# Altium schematic symbol library jlcpcb_2025_04_inductors_extended_0603.schlib: 1269 symbols (part 5 of 7) (continued)
## MLF1608A3R3JTD25
designator L?  Inductance: 3.3uH
Inductor, 3.3uH, ±5%, 550mΩ, 30mA, SMD 0603; Manufacturer: TDK; Manufacturer Part Number: MLF1608A3R3JTD25; Self-Resonant Frequency: 65MHz; Q Factor: 35@10MHz; Package Size: 0603; JLCPCB Basic Part: No; JLCPCB Part Number: C404525; Supplier 1: LCSC; Category: Inductors; Supplier Part Number 1: C404525; Tolerance: ±5%; Rated Current: 30mA; DC Resistance: 550mΩ; RoHS: Yes; ComponentLink1Description: Datasheet; ComponentLink1URL: https://wmsc.lcsc.com/wmsc/upload/file/pdf/v2/lcsc/2304140030_TDK-MLF1608A3R3JTD25_C404525.pdf; ComponentLink2Description: JLCPCB Part URL; ComponentLink2URL: https://jlcpcb.com/partdetail/C404525; ComponentLink3Description: LCSC Part URL; ComponentLink3URL: https://lcsc.com/product-detail/Inductors-SMD_TDK-TDK-MLF1608A3R3JTD25_C404525.html
footprint IND-0603 (0603 (1608M) Inductor)
pins: 1, 2

## MLF1608A3R3KTA00
designator L?  Inductance: 3.3uH
Inductor, 3.3uH, ±10%, 550mΩ, 30mA, SMD 0603; Manufacturer: TDK; Manufacturer Part Number: MLF1608A3R3KTA00; Self-Resonant Frequency: 65MHz; Q Factor: 35@10MHz; Package Size: 0603; JLCPCB Basic Part: No; JLCPCB Part Number: C574026; Supplier 1: LCSC; Category: Inductors; Supplier Part Number 1: C574026; Tolerance: ±10%; Rated Current: 30mA; DC Resistance: 550mΩ; RoHS: Yes; ComponentLink1Description: Datasheet; ComponentLink1URL: https://wmsc.lcsc.com/wmsc/upload/file/pdf/v2/lcsc/2304140030_TDK-MLF1608A3R3KTA00_C574026.pdf; ComponentLink2Description: JLCPCB Part URL; ComponentLink2URL: https://jlcpcb.com/partdetail/C574026; ComponentLink3Description: LCSC Part URL; ComponentLink3URL: https://lcsc.com/product-detail/Inductors-SMD_TDK-TDK-MLF1608A3R3KTA00_C574026.html
footprint IND-0603 (0603 (1608M) Inductor)
pins: 1, 2

## MLF1608A4R7JT000
designator L?  Inductance: 4.7uH
Inductor, 4.7uH, ±5%, 750mΩ, 30mA, SMD 0603; Manufacturer: TDK; Manufacturer Part Number: MLF1608A4R7JT000; Self-Resonant Frequency: 55MHz; Q Factor: 35@10MHz; Package Size: 0603; JLCPCB Basic Part: No; JLCPCB Part Number: C87515; Supplier 1: LCSC; Category: Inductors; Supplier Part Number 1: C87515; Tolerance: ±5%; Rated Current: 30mA; DC Resistance: 750mΩ; RoHS: Yes; ComponentLink1Description: Datasheet; ComponentLink1URL: https://wmsc.lcsc.com/wmsc/upload/file/pdf/v2/lcsc/2304140030_TDK-MLF1608A4R7JT000_C87515.pdf; ComponentLink2Description: JLCPCB Part URL; ComponentLink2URL: https://jlcpcb.com/partdetail/C87515; ComponentLink3Description: LCSC Part URL; ComponentLink3URL: https://lcsc.com/product-detail/Inductors-SMD_TDK-TDK-MLF1608A4R7JT000_C87515.html
footprint IND-0603 (0603 (1608M) Inductor)
pins: 1, 2

## MLF1608A4R7KTA00
designator L?  Inductance: 4.7uH
Inductor, 4.7uH, ±10%, 750mΩ, 30mA, SMD 0603; Manufacturer: TDK; Manufacturer Part Number: MLF1608A4R7KTA00; Self-Resonant Frequency: 80MHz; Q Factor: 60@10MHz; Package Size: 0603; JLCPCB Basic Part: No; JLCPCB Part Number: C76730; Supplier 1: LCSC; Category: Inductors; Supplier Part Number 1: C76730; Tolerance: ±10%; Rated Current: 30mA; DC Resistance: 750mΩ; RoHS: Yes; ComponentLink1Description: Datasheet; ComponentLink1URL: https://wmsc.lcsc.com/wmsc/upload/file/pdf/v2/lcsc/2304140030_TDK-MLF1608A4R7KTA00_C76730.pdf; ComponentLink2Description: JLCPCB Part URL; ComponentLink2URL: https://jlcpcb.com/partdetail/C76730; ComponentLink3Description: LCSC Part URL; ComponentLink3URL: https://lcsc.com/product-detail/Inductors-SMD_TDK-TDK-MLF1608A4R7KTA00_C76730.html
footprint IND-0603 (0603 (1608M) Inductor)
pins: 1, 2

## MLF1608A4R7KTD25
designator L?  Inductance: 4.7uH
Inductor, 4.7uH, ±10%, 750mΩ, 30mA, SMD 0603; Manufacturer: TDK; Manufacturer Part Number: MLF1608A4R7KTD25; Self-Resonant Frequency: 80MHz; Q Factor: 60@10MHz; Package Size: 0603; JLCPCB Basic Part: No; JLCPCB Part Number: C193265; Supplier 1: LCSC; Category: Inductors; Supplier Part Number 1: C193265; Tolerance: ±10%; Rated Current: 30mA; DC Resistance: 750mΩ; RoHS: Yes; ComponentLink1Description: Datasheet; ComponentLink1URL: https://wmsc.lcsc.com/wmsc/upload/file/pdf/v2/lcsc/2304140030_TDK-MLF1608A4R7KTD25_C193265.pdf; ComponentLink2Description: JLCPCB Part URL; ComponentLink2URL: https://jlcpcb.com/partdetail/C193265; ComponentLink3Description: LCSC Part URL; ComponentLink3URL: https://lcsc.com/product-detail/Inductors-SMD_TDK-TDK-MLF1608A4R7KTD25_C193265.html
footprint IND-0603 (0603 (1608M) Inductor)
pins: 1, 2

## MLF1608A4R7MTD25
designator L?  Inductance: 4.7uH
Inductor, 4.7uH, ±20%, 750mΩ, 30mA, SMD 0603; Manufacturer: TDK; Manufacturer Part Number: MLF1608A4R7MTD25; Self-Resonant Frequency: 55MHz; Q Factor: 35@10MHz; Package Size: 0603; JLCPCB Basic Part: No; JLCPCB Part Number: C502019; Supplier 1: LCSC; Category: Inductors; Supplier Part Number 1: C502019; Tolerance: ±20%; Rated Current: 30mA; DC Resistance: 750mΩ; RoHS: Yes; ComponentLink1Description: Datasheet; ComponentLink1URL: https://wmsc.lcsc.com/wmsc/upload/file/pdf/v2/lcsc/2304140030_TDK-MLF1608A4R7MTD25_C502019.pdf; ComponentLink2Description: JLCPCB Part URL; ComponentLink2URL: https://jlcpcb.com/partdetail/C502019; ComponentLink3Description: LCSC Part URL; ComponentLink3URL: https://lcsc.com/product-detail/Inductors-SMD_TDK-TDK-MLF1608A4R7MTD25_C502019.html
footprint IND-0603 (0603 (1608M) Inductor)
pins: 1, 2

## MLF1608C150KTA00
designator L?  Inductance: 15uH
Inductor, 15uH, ±10%, 800mΩ, 2mA, SMD 0603; Manufacturer: TDK; Manufacturer Part Number: MLF1608C150KTA00; Self-Resonant Frequency: 42MHz; Q Factor: 40@1MHz; Package Size: 0603; JLCPCB Basic Part: No; JLCPCB Part Number: C275348; Supplier 1: LCSC; Category: Inductors; Supplier Part Number 1: C275348; Tolerance: ±10%; Rated Current: 2mA; DC Resistance: 800mΩ; RoHS: Yes; ComponentLink1Description: Datasheet; ComponentLink1URL: https://wmsc.lcsc.com/wmsc/upload/file/pdf/v2/lcsc/2304140030_TDK-MLF1608C150KTA00_C275348.pdf; ComponentLink2Description: JLCPCB Part URL; ComponentLink2URL: https://jlcpcb.com/partdetail/C275348; ComponentLink3Description: LCSC Part URL; ComponentLink3URL: https://lcsc.com/product-detail/Inductors-SMD_TDK-TDK-MLF1608C150KTA00_C275348.html
footprint IND-0603 (0603 (1608M) Inductor)
pins: 1, 2

## MLF1608C180KTA00
designator L?  Inductance: 18uH
Inductor, 18uH, ±10%, 850mΩ, 2mA, SMD 0603; Manufacturer: TDK; Manufacturer Part Number: MLF1608C180KTA00; Self-Resonant Frequency: 40MHz; Q Factor: 40@1MHz; Package Size: 0603; JLCPCB Basic Part: No; JLCPCB Part Number: C275349; Supplier 1: LCSC; Category: Inductors; Supplier Part Number 1: C275349; Tolerance: ±10%; Rated Current: 2mA; DC Resistance: 850mΩ; RoHS: Yes; ComponentLink1Description: Datasheet; ComponentLink1URL: https://wmsc.lcsc.com/wmsc/upload/file/pdf/v2/lcsc/2304140030_TDK-MLF1608C180KTA00_C275349.pdf; ComponentLink2Description: JLCPCB Part URL; ComponentLink2URL: https://jlcpcb.com/partdetail/C275349; ComponentLink3Description: LCSC Part URL; ComponentLink3URL: https://lcsc.com/product-detail/Inductors-SMD_TDK-TDK-MLF1608C180KTA00_C275349.html
footprint IND-0603 (0603 (1608M) Inductor)
pins: 1, 2

## MLF1608C180KTD25
designator L?  Inductance: 18uH
Inductor, 18uH, ±10%, 850mΩ, 2mA, SMD 0603; Manufacturer: TDK; Manufacturer Part Number: MLF1608C180KTD25; Self-Resonant Frequency: 40MHz; Q Factor: 40@1MHz; Package Size: 0603; JLCPCB Basic Part: No; JLCPCB Part Number: C524458; Supplier 1: LCSC; Category: Inductors; Supplier Part Number 1: C524458; Tolerance: ±10%; Rated Current: 2mA; DC Resistance: 850mΩ; RoHS: Yes; ComponentLink1Description: Datasheet; ComponentLink1URL: https://wmsc.lcsc.com/wmsc/upload/file/pdf/v2/lcsc/2007171235_TDK-MLF1608C180KTD25_C524458.pdf; ComponentLink2Description: JLCPCB Part URL; ComponentLink2URL: https://jlcpcb.com/partdetail/C524458; ComponentLink3Description: LCSC Part URL; ComponentLink3URL: https://lcsc.com/product-detail/Inductors-SMD_TDK-TDK-MLF1608C180KTD25_C524458.html
footprint IND-0603 (0603 (1608M) Inductor)
pins: 1, 2

## MLF1608C220KTA00
designator L?  Inductance: 22uH
Inductor, 22uH, ±10%, 900mΩ, 2mA, SMD 0603; Manufacturer: TDK; Manufacturer Part Number: MLF1608C220KTA00; Self-Resonant Frequency: 18MHz; Q Factor: 20@1MHz; Package Size: 0603; JLCPCB Basic Part: No; JLCPCB Part Number: C275350; Supplier 1: LCSC; Category: Inductors; Supplier Part Number 1: C275350; Tolerance: ±10%; Rated Current: 2mA; DC Resistance: 900mΩ; RoHS: Yes; ComponentLink1Description: Datasheet; ComponentLink1URL: https://wmsc.lcsc.com/wmsc/upload/file/pdf/v2/lcsc/2304140030_TDK-MLF1608C220KTA00_C275350.pdf; ComponentLink2Description: JLCPCB Part URL; ComponentLink2URL: https://jlcpcb.com/partdetail/C275350; ComponentLink3Description: LCSC Part URL; ComponentLink3URL: https://lcsc.com/product-detail/Inductors-SMD_TDK-TDK-MLF1608C220KTA00_C275350.html
footprint IND-0603 (0603 (1608M) Inductor)
pins: 1, 2

## MLF1608C220KTD25
designator L?  Inductance: 22uH
Inductor, 22uH, ±10%, 900mΩ, 2mA, SMD 0603; Manufacturer: TDK; Manufacturer Part Number: MLF1608C220KTD25; Self-Resonant Frequency: 38MHz; Q Factor: 40@1MHz; Package Size: 0603; JLCPCB Basic Part: No; JLCPCB Part Number: C1330708; Supplier 1: LCSC; Category: Inductors; Supplier Part Number 1: C1330708; Tolerance: ±10%; Rated Current: 2mA; DC Resistance: 900mΩ; RoHS: Yes; ComponentLink1Description: Datasheet; ComponentLink1URL: https://wmsc.lcsc.com/wmsc/upload/file/pdf/v2/lcsc/2304140030_TDK-MLF1608C220KTD25_C1330708.pdf; ComponentLink2Description: JLCPCB Part URL; ComponentLink2URL: https://jlcpcb.com/partdetail/C1330708; ComponentLink3Description: LCSC Part URL; ComponentLink3URL: https://lcsc.com/product-detail/Inductors-SMD_TDK-TDK-MLF1608C220KTD25_C1330708.html
footprint IND-0603 (0603 (1608M) Inductor)
pins: 1, 2

## MLF1608C330KTD00
designator L?  Inductance: 33uH
Inductor, 33uH, ±10%, 1.4Ω, 2mA, SMD 0603; Manufacturer: TDK; Manufacturer Part Number: MLF1608C330KTD00; Self-Resonant Frequency: 10MHz; Q Factor: 20@1MHz; Package Size: 0603; JLCPCB Basic Part: No; JLCPCB Part Number: C275351; Supplier 1: LCSC; Category: Inductors; Supplier Part Number 1: C275351; Tolerance: ±10%; Rated Current: 2mA; DC Resistance: 1.4Ω; RoHS: Yes; ComponentLink1Description: Datasheet; ComponentLink1URL: https://wmsc.lcsc.com/wmsc/upload/file/pdf/v2/lcsc/2304140030_TDK-MLF1608C330KTD00_C275351.pdf; ComponentLink2Description: JLCPCB Part URL; ComponentLink2URL: https://jlcpcb.com/partdetail/C275351; ComponentLink3Description: LCSC Part URL; ComponentLink3URL: https://lcsc.com/product-detail/Inductors-SMD_TDK-TDK-MLF1608C330KTD00_C275351.html
footprint IND-0603 (0603 (1608M) Inductor)
pins: 1, 2

## MLF1608D47NMTA00
designator L?  Inductance: 47nH
Inductor, 47nH, ±20%, 100mΩ, 200mA, SMD 0603; Manufacturer: TDK; Manufacturer Part Number: MLF1608D47NMTA00; Self-Resonant Frequency: 900MHz; Q Factor: 20@50MHz; Package Size: 0603; JLCPCB Basic Part: No; JLCPCB Part Number: C440659; Supplier 1: LCSC; Category: Inductors; Supplier Part Number 1: C440659; Tolerance: ±20%; Rated Current: 200mA; DC Resistance: 100mΩ; RoHS: Yes; ComponentLink1Description: Datasheet; ComponentLink1URL: https://wmsc.lcsc.com/wmsc/upload/file/pdf/v2/lcsc/1912111437_TDK-MLF1608D47NMTA00_C440659.pdf; ComponentLink2Description: JLCPCB Part URL; ComponentLink2URL: https://jlcpcb.com/partdetail/C440659; ComponentLink3Description: LCSC Part URL; ComponentLink3URL: https://lcsc.com/product-detail/Inductors-SMD_TDK-TDK-MLF1608D47NMTA00_C440659.html
footprint IND-0603 (0603 (1608M) Inductor)
pins: 1, 2

## MLF1608D68NMTA00
designator L?  Inductance: 68nH
Inductor, 68nH, ±20%, 150mΩ, 200mA, SMD 0603; Manufacturer: TDK; Manufacturer Part Number: MLF1608D68NMTA00; Self-Resonant Frequency: 700MHz; Q Factor: 20@50MHz; Package Size: 0603; JLCPCB Basic Part: No; JLCPCB Part Number: C275352; Supplier 1: LCSC; Category: Inductors; Supplier Part Number 1: C275352; Tolerance: ±20%; Rated Current: 200mA; DC Resistance: 150mΩ; RoHS: Yes; ComponentLink1Description: Datasheet; ComponentLink1URL: https://wmsc.lcsc.com/wmsc/upload/file/pdf/v2/lcsc/2304140030_TDK-MLF1608D68NMTA00_C275352.pdf; ComponentLink2Description: JLCPCB Part URL; ComponentLink2URL: https://jlcpcb.com/partdetail/C275352; ComponentLink3Description: LCSC Part URL; ComponentLink3URL: https://lcsc.com/product-detail/Inductors-SMD_TDK-TDK-MLF1608D68NMTA00_C275352.html
footprint IND-0603 (0603 (1608M) Inductor)
pins: 1, 2

## MLF1608D82NMTD25
designator L?  Inductance: 82nH
Inductor, 82nH, ±20%, 150mΩ, 200mA, SMD 0603; Manufacturer: TDK; Manufacturer Part Number: MLF1608D82NMTD25; Self-Resonant Frequency: 500MHz; Q Factor: 10@50MHz; Package Size: 0603; JLCPCB Basic Part: No; JLCPCB Part Number: C165813; Supplier 1: LCSC; Category: Inductors; Supplier Part Number 1: C165813; Tolerance: ±20%; Rated Current: 200mA; DC Resistance: 150mΩ; RoHS: Yes; ComponentLink1Description: Datasheet; ComponentLink1URL: https://wmsc.lcsc.com/wmsc/upload/file/pdf/v2/lcsc/1811131649_TDK-MLF1608D82NMTD25_C165813.pdf; ComponentLink2Description: JLCPCB Part URL; ComponentLink2URL: https://jlcpcb.com/partdetail/C165813; ComponentLink3Description: LCSC Part URL; ComponentLink3URL: https://lcsc.com/product-detail/Inductors-SMD_TDK-TDK-MLF1608D82NMTD25_C165813.html
footprint IND-0603 (0603 (1608M) Inductor)
pins: 1, 2

## MLF1608DR10KTA00
designator L?  Inductance: 100nH
Inductor, 100nH, ±10%, 200mΩ, 200mA, SMD 0603; Manufacturer: TDK; Manufacturer Part Number: MLF1608DR10KTA00; Self-Resonant Frequency: 450MHz; Q Factor: 15@25MHz; Package Size: 0603; JLCPCB Basic Part: No; JLCPCB Part Number: C87516; Supplier 1: LCSC; Category: Inductors; Supplier Part Number 1: C87516; Tolerance: ±10%; Rated Current: 200mA; DC Resistance: 200mΩ; RoHS: Yes; ComponentLink1Description: Datasheet; ComponentLink1URL: https://wmsc.lcsc.com/wmsc/upload/file/pdf/v2/lcsc/2304140030_TDK-MLF1608DR10KTA00_C87516.pdf; ComponentLink2Description: JLCPCB Part URL; ComponentLink2URL: https://jlcpcb.com/partdetail/C87516; ComponentLink3Description: LCSC Part URL; ComponentLink3URL: https://lcsc.com/product-detail/Inductors-SMD_TDK-TDK-MLF1608DR10KTA00_C87516.html
footprint IND-0603 (0603 (1608M) Inductor)
pins: 1, 2

## MLF1608DR12JT000
designator L?  Inductance: 120nH
Inductor, 120nH, ±5%, 200mΩ, 200mA, SMD 0603; Manufacturer: TDK; Manufacturer Part Number: MLF1608DR12JT000; Self-Resonant Frequency: 400MHz; Q Factor: 15@25MHz; Package Size: 0603; JLCPCB Basic Part: No; JLCPCB Part Number: C275354; Supplier 1: LCSC; Category: Inductors; Supplier Part Number 1: C275354; Tolerance: ±5%; Rated Current: 200mA; DC Resistance: 200mΩ; RoHS: Yes; ComponentLink1Description: Datasheet; ComponentLink1URL: https://wmsc.lcsc.com/wmsc/upload/file/pdf/v2/lcsc/2304140030_TDK-MLF1608DR12JT000_C275354.pdf; ComponentLink2Description: JLCPCB Part URL; ComponentLink2URL: https://jlcpcb.com/partdetail/C275354; ComponentLink3Description: LCSC Part URL; ComponentLink3URL: https://lcsc.com/product-detail/Inductors-SMD_TDK-TDK-MLF1608DR12JT000_C275354.html
footprint IND-0603 (0603 (1608M) Inductor)
pins: 1, 2

## MLF1608DR12JTD25
designator L?  Inductance: 120nH
Inductor, 120nH, ±5%, 200mΩ, 200mA, SMD 0603; Manufacturer: TDK; Manufacturer Part Number: MLF1608DR12JTD25; Self-Resonant Frequency: 550MHz; Q Factor: 25@25MHz; Package Size: 0603; JLCPCB Basic Part: No; JLCPCB Part Number: C404510; Supplier 1: LCSC; Category: Inductors; Supplier Part Number 1: C404510; Tolerance: ±5%; Rated Current: 200mA; DC Resistance: 200mΩ; RoHS: Yes; ComponentLink1Description: Datasheet; ComponentLink1URL: https://wmsc.lcsc.com/wmsc/upload/file/pdf/v2/lcsc/2304140030_TDK-MLF1608DR12JTD25_C404510.pdf; ComponentLink2Description: JLCPCB Part URL; ComponentLink2URL: https://jlcpcb.com/partdetail/C404510; ComponentLink3Description: LCSC Part URL; ComponentLink3URL: https://lcsc.com/product-detail/Inductors-SMD_TDK-TDK-MLF1608DR12JTD25_C404510.html
footprint IND-0603 (0603 (1608M) Inductor)
pins: 1, 2

## MLF1608DR12KTA00
designator L?  Inductance: 120nH
Inductor, 120nH, ±10%, 200mΩ, 200mA, SMD 0603; Manufacturer: TDK; Manufacturer Part Number: MLF1608DR12KTA00; Self-Resonant Frequency: 400MHz; Q Factor: 15@25MHz; Package Size: 0603; JLCPCB Basic Part: No; JLCPCB Part Number: C87517; Supplier 1: LCSC; Category: Inductors; Supplier Part Number 1: C87517; Tolerance: ±10%; Rated Current: 200mA; DC Resistance: 200mΩ; RoHS: Yes; ComponentLink1Description: Datasheet; ComponentLink1URL: https://wmsc.lcsc.com/wmsc/upload/file/pdf/v2/lcsc/2304140030_TDK-MLF1608DR12KTA00_C87517.pdf; ComponentLink2Description: JLCPCB Part URL; ComponentLink2URL: https://jlcpcb.com/partdetail/C87517; ComponentLink3Description: LCSC Part URL; ComponentLink3URL: https://lcsc.com/product-detail/Inductors-SMD_TDK-TDK-MLF1608DR12KTA00_C87517.html
footprint IND-0603 (0603 (1608M) Inductor)
pins: 1, 2

## MLF1608DR15JT000
designator L?  Inductance: 150nH
Inductor, 150nH, ±5%, 250mΩ, 200mA, SMD 0603; Manufacturer: TDK; Manufacturer Part Number: MLF1608DR15JT000; Self-Resonant Frequency: 500MHz; Q Factor: 25@25MHz; Package Size: 0603; JLCPCB Basic Part: No; JLCPCB Part Number: C87518; Supplier 1: LCSC; Category: Inductors; Supplier Part Number 1: C87518; Tolerance: ±5%; Rated Current: 200mA; DC Resistance: 250mΩ; RoHS: Yes; ComponentLink1Description: Datasheet; ComponentLink1URL: https://wmsc.lcsc.com/wmsc/upload/file/pdf/v2/lcsc/2304140030_TDK-MLF1608DR15JT000_C87518.pdf; ComponentLink2Description: JLCPCB Part URL; ComponentLink2URL: https://jlcpcb.com/partdetail/C87518; ComponentLink3Description: LCSC Part URL; ComponentLink3URL: https://lcsc.com/product-detail/Inductors-SMD_TDK-TDK-MLF1608DR15JT000_C87518.html
footprint IND-0603 (0603 (1608M) Inductor)
pins: 1, 2

## MLF1608DR22JT000
designator L?  Inductance: 220nH
Inductor, 220nH, ±5%, 300mΩ, 150mA, SMD 0603; Manufacturer: TDK; Manufacturer Part Number: MLF1608DR22JT000; Self-Resonant Frequency: 400MHz; Q Factor: 25@25MHz; Package Size: 0603; JLCPCB Basic Part: No; JLCPCB Part Number: C136220; Supplier 1: LCSC; Category: Inductors; Supplier Part Number 1: C136220; Tolerance: ±5%; Rated Current: 150mA; DC Resistance: 300mΩ; RoHS: Yes; ComponentLink1Description: Datasheet; ComponentLink1URL: https://wmsc.lcsc.com/wmsc/upload/file/pdf/v2/lcsc/2304140030_TDK-MLF1608DR22JT000_C136220.pdf; ComponentLink2Description: JLCPCB Part URL; ComponentLink2URL: https://jlcpcb.com/partdetail/C136220; ComponentLink3Description: LCSC Part URL; ComponentLink3URL: https://lcsc.com/product-detail/Inductors-SMD_TDK-TDK-MLF1608DR22JT000_C136220.html
footprint IND-0603 (0603 (1608M) Inductor)
pins: 1, 2

## MLF1608DR22KTA00
designator L?  Inductance: 220nH
Inductor, 220nH, ±10%, 300mΩ, 150mA, SMD 0603; Manufacturer: TDK; Manufacturer Part Number: MLF1608DR22KTA00; Self-Resonant Frequency: 290MHz; Q Factor: 15@25MHz; Package Size: 0603; JLCPCB Basic Part: No; JLCPCB Part Number: C433006; Supplier 1: LCSC; Category: Inductors; Supplier Part Number 1: C433006; Tolerance: ±10%; Rated Current: 150mA; DC Resistance: 300mΩ; RoHS: Yes; ComponentLink1Description: Datasheet; ComponentLink1URL: https://wmsc.lcsc.com/wmsc/upload/file/pdf/v2/lcsc/2304140030_TDK-MLF1608DR22KTA00_C433006.pdf; ComponentLink2Description: JLCPCB Part URL; ComponentLink2URL: https://jlcpcb.com/partdetail/C433006; ComponentLink3Description: LCSC Part URL; ComponentLink3URL: https://lcsc.com/product-detail/Inductors-SMD_TDK-TDK-MLF1608DR22KTA00_C433006.html
footprint IND-0603 (0603 (1608M) Inductor)
pins: 1, 2

## MLF1608DR27JT000
designator L?  Inductance: 270nH
Inductor, 270nH, ±5%, 350mΩ, 150mA, SMD 0603; Manufacturer: TDK; Manufacturer Part Number: MLF1608DR27JT000; Self-Resonant Frequency: 260MHz; Q Factor: 15@25MHz; Package Size: 0603; JLCPCB Basic Part: No; JLCPCB Part Number: C87519; Supplier 1: LCSC; Category: Inductors; Supplier Part Number 1: C87519; Tolerance: ±5%; Rated Current: 150mA; DC Resistance: 350mΩ; RoHS: Yes; ComponentLink1Description: Datasheet; ComponentLink1URL: https://wmsc.lcsc.com/wmsc/upload/file/pdf/v2/lcsc/2304140030_TDK-MLF1608DR27JT000_C87519.pdf; ComponentLink2Description: JLCPCB Part URL; ComponentLink2URL: https://jlcpcb.com/partdetail/C87519; ComponentLink3Description: LCSC Part URL; ComponentLink3URL: https://lcsc.com/product-detail/Inductors-SMD_TDK-TDK-MLF1608DR27JT000_C87519.html
footprint IND-0603 (0603 (1608M) Inductor)
pins: 1, 2

## MLF1608DR33JT000
designator L?  Inductance: 330nH
Inductor, 330nH, ±5%, 400mΩ, 100mA, SMD 0603; Manufacturer: TDK; Manufacturer Part Number: MLF1608DR33JT000; Self-Resonant Frequency: 230MHz; Q Factor: 15@25MHz; Package Size: 0603; JLCPCB Basic Part: No; JLCPCB Part Number: C275357; Supplier 1: LCSC; Category: Inductors; Supplier Part Number 1: C275357; Tolerance: ±5%; Rated Current: 100mA; DC Resistance: 400mΩ; RoHS: Yes; ComponentLink1Description: Datasheet; ComponentLink1URL: https://wmsc.lcsc.com/wmsc/upload/file/pdf/v2/lcsc/2304140030_TDK-MLF1608DR33JT000_C275357.pdf; ComponentLink2Description: JLCPCB Part URL; ComponentLink2URL: https://jlcpcb.com/partdetail/C275357; ComponentLink3Description: LCSC Part URL; ComponentLink3URL: https://lcsc.com/product-detail/Inductors-SMD_TDK-TDK-MLF1608DR33JT000_C275357.html
footprint IND-0603 (0603 (1608M) Inductor)
pins: 1, 2

## MLF1608DR33KTA00
designator L?  Inductance: 330nH
Inductor, 330nH, ±10%, 400mΩ, 100mA, SMD 0603; Manufacturer: TDK; Manufacturer Part Number: MLF1608DR33KTA00; Self-Resonant Frequency: 230MHz; Q Factor: 15@25MHz; Package Size: 0603; JLCPCB Basic Part: No; JLCPCB Part Number: C87520; Supplier 1: LCSC; Category: Inductors; Supplier Part Number 1: C87520; Tolerance: ±10%; Rated Current: 100mA; DC Resistance: 400mΩ; RoHS: Yes; ComponentLink1Description: Datasheet; ComponentLink1URL: https://wmsc.lcsc.com/wmsc/upload/file/pdf/v2/lcsc/2304140030_TDK-MLF1608DR33KTA00_C87520.pdf; ComponentLink2Description: JLCPCB Part URL; ComponentLink2URL: https://jlcpcb.com/partdetail/C87520; ComponentLink3Description: LCSC Part URL; ComponentLink3URL: https://lcsc.com/product-detail/Inductors-SMD_TDK-TDK-MLF1608DR33KTA00_C87520.html
footprint IND-0603 (0603 (1608M) Inductor)
pins: 1, 2

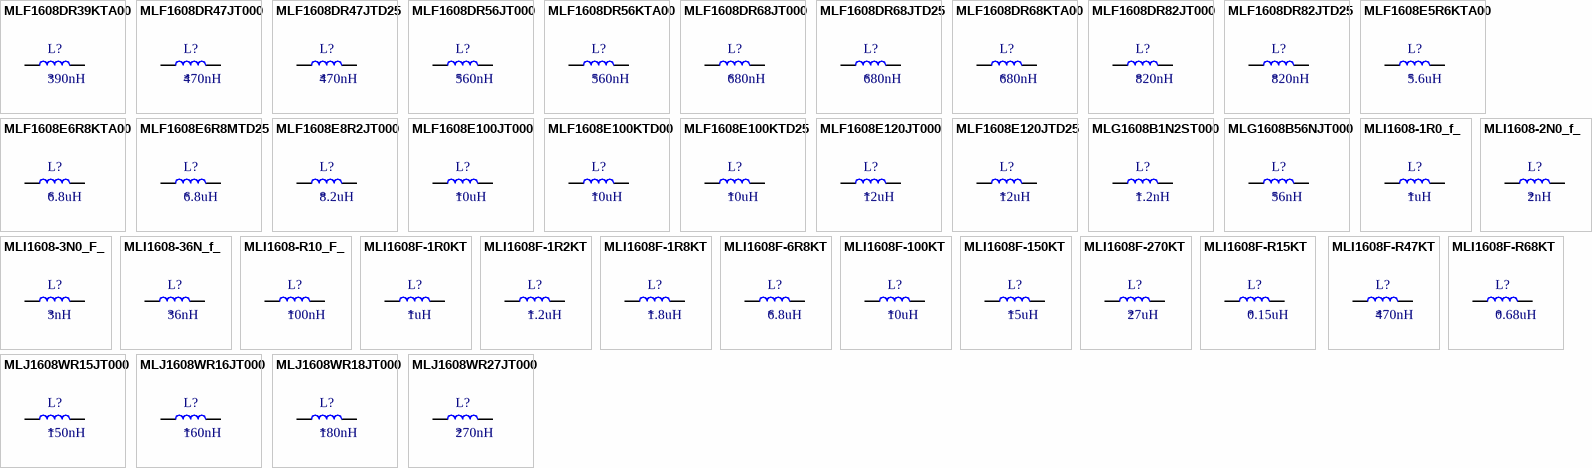
[diagram p21: symbols MLF1608DR39KTA00 to MLJ1608WR27JT000]

## MLF1608DR39KTA00
designator L?  Inductance: 390nH
Inductor, 390nH, ±10%, 450mΩ, 100mA, SMD 0603; Manufacturer: TDK; Manufacturer Part Number: MLF1608DR39KTA00; Self-Resonant Frequency: 210MHz; Q Factor: 15@25MHz; Package Size: 0603; JLCPCB Basic Part: No; JLCPCB Part Number: C76731; Supplier 1: LCSC; Category: Inductors; Supplier Part Number 1: C76731; Tolerance: ±10%; Rated Current: 100mA; DC Resistance: 450mΩ; RoHS: Yes; ComponentLink1Description: Datasheet; ComponentLink1URL: https://wmsc.lcsc.com/wmsc/upload/file/pdf/v2/lcsc/2304140030_TDK-MLF1608DR39KTA00_C76731.pdf; ComponentLink2Description: JLCPCB Part URL; ComponentLink2URL: https://jlcpcb.com/partdetail/C76731; ComponentLink3Description: LCSC Part URL; ComponentLink3URL: https://lcsc.com/product-detail/Inductors-SMD_TDK-TDK-MLF1608DR39KTA00_C76731.html
footprint IND-0603 (0603 (1608M) Inductor)
pins: 1, 2

## MLF1608DR47JT000
designator L?  Inductance: 470nH
Inductor, 470nH, ±5%, 500mΩ, 100mA, SMD 0603; Manufacturer: TDK; Manufacturer Part Number: MLF1608DR47JT000; Self-Resonant Frequency: 260MHz; Q Factor: 30@25MHz; Package Size: 0603; JLCPCB Basic Part: No; JLCPCB Part Number: C275359; Supplier 1: LCSC; Category: Inductors; Supplier Part Number 1: C275359; Tolerance: ±5%; Rated Current: 100mA; DC Resistance: 500mΩ; RoHS: Yes; ComponentLink1Description: Datasheet; ComponentLink1URL: https://wmsc.lcsc.com/wmsc/upload/file/pdf/v2/lcsc/2304140030_TDK-MLF1608DR47JT000_C275359.pdf; ComponentLink2Description: JLCPCB Part URL; ComponentLink2URL: https://jlcpcb.com/partdetail/C275359; ComponentLink3Description: LCSC Part URL; ComponentLink3URL: https://lcsc.com/product-detail/Inductors-SMD_TDK-TDK-MLF1608DR47JT000_C275359.html
footprint IND-0603 (0603 (1608M) Inductor)
pins: 1, 2

## MLF1608DR47JTD25
designator L?  Inductance: 470nH
Inductor, 470nH, ±5%, 500mΩ, 100mA, SMD 0603; Manufacturer: TDK; Manufacturer Part Number: MLF1608DR47JTD25; Self-Resonant Frequency: 190MHz; Q Factor: 15@25MHz; Package Size: 0603; JLCPCB Basic Part: No; JLCPCB Part Number: C404517; Supplier 1: LCSC; Category: Inductors; Supplier Part Number 1: C404517; Tolerance: ±5%; Rated Current: 100mA; DC Resistance: 500mΩ; RoHS: Yes; ComponentLink1Description: Datasheet; ComponentLink1URL: https://wmsc.lcsc.com/wmsc/upload/file/pdf/v2/lcsc/2304140030_TDK-MLF1608DR47JTD25_C404517.pdf; ComponentLink2Description: JLCPCB Part URL; ComponentLink2URL: https://jlcpcb.com/partdetail/C404517; ComponentLink3Description: LCSC Part URL; ComponentLink3URL: https://lcsc.com/product-detail/Inductors-SMD_TDK-TDK-MLF1608DR47JTD25_C404517.html
footprint IND-0603 (0603 (1608M) Inductor)
pins: 1, 2

## MLF1608DR56JT000
designator L?  Inductance: 560nH
Inductor, 560nH, ±5%, 550mΩ, 100mA, SMD 0603; Manufacturer: TDK; Manufacturer Part Number: MLF1608DR56JT000; Self-Resonant Frequency: 230MHz; Q Factor: 30@25MHz; Package Size: 0603; JLCPCB Basic Part: No; JLCPCB Part Number: C114773; Supplier 1: LCSC; Category: Inductors; Supplier Part Number 1: C114773; Tolerance: ±5%; Rated Current: 100mA; DC Resistance: 550mΩ; RoHS: Yes; ComponentLink1Description: Datasheet; ComponentLink1URL: https://wmsc.lcsc.com/wmsc/upload/file/pdf/v2/lcsc/2304140030_TDK-MLF1608DR56JT000_C114773.pdf; ComponentLink2Description: JLCPCB Part URL; ComponentLink2URL: https://jlcpcb.com/partdetail/C114773; ComponentLink3Description: LCSC Part URL; ComponentLink3URL: https://lcsc.com/product-detail/Inductors-SMD_TDK-TDK-MLF1608DR56JT000_C114773.html
footprint IND-0603 (0603 (1608M) Inductor)
pins: 1, 2

## MLF1608DR56KTA00
designator L?  Inductance: 560nH
Inductor, 560nH, ±10%, 550mΩ, 100mA, SMD 0603; Manufacturer: TDK; Manufacturer Part Number: MLF1608DR56KTA00; Self-Resonant Frequency: 170MHz; Q Factor: 15@25MHz; Package Size: 0603; JLCPCB Basic Part: No; JLCPCB Part Number: C136254; Supplier 1: LCSC; Category: Inductors; Supplier Part Number 1: C136254; Tolerance: ±10%; Rated Current: 100mA; DC Resistance: 550mΩ; RoHS: Yes; ComponentLink1Description: Datasheet; ComponentLink1URL: https://wmsc.lcsc.com/wmsc/upload/file/pdf/v2/lcsc/2304140030_TDK-MLF1608DR56KTA00_C136254.pdf; ComponentLink2Description: JLCPCB Part URL; ComponentLink2URL: https://jlcpcb.com/partdetail/C136254; ComponentLink3Description: LCSC Part URL; ComponentLink3URL: https://lcsc.com/product-detail/Inductors-SMD_TDK-TDK-MLF1608DR56KTA00_C136254.html
footprint IND-0603 (0603 (1608M) Inductor)
pins: 1, 2

## MLF1608DR68JT000
designator L?  Inductance: 680nH
Inductor, 680nH, ±5%, 650mΩ, 70mA, SMD 0603; Manufacturer: TDK; Manufacturer Part Number: MLF1608DR68JT000; Self-Resonant Frequency: 150MHz; Q Factor: 15@25MHz; Package Size: 0603; JLCPCB Basic Part: No; JLCPCB Part Number: C307693; Supplier 1: LCSC; Category: Inductors; Supplier Part Number 1: C307693; Tolerance: ±5%; Rated Current: 70mA; DC Resistance: 650mΩ; RoHS: Yes; ComponentLink1Description: Datasheet; ComponentLink1URL: https://wmsc.lcsc.com/wmsc/upload/file/pdf/v2/lcsc/2304140030_TDK-MLF1608DR68JT000_C307693.pdf; ComponentLink2Description: JLCPCB Part URL; ComponentLink2URL: https://jlcpcb.com/partdetail/C307693; ComponentLink3Description: LCSC Part URL; ComponentLink3URL: https://lcsc.com/product-detail/Inductors-SMD_TDK-TDK-MLF1608DR68JT000_C307693.html
footprint IND-0603 (0603 (1608M) Inductor)
pins: 1, 2

## MLF1608DR68JTD25
designator L?  Inductance: 680nH
Inductor, 680nH, ±5%, 650mΩ, 70mA, SMD 0603; Manufacturer: TDK; Manufacturer Part Number: MLF1608DR68JTD25; Self-Resonant Frequency: 210MHz; Q Factor: 30@25MHz; Package Size: 0603; JLCPCB Basic Part: No; JLCPCB Part Number: C404519; Supplier 1: LCSC; Category: Inductors; Supplier Part Number 1: C404519; Tolerance: ±5%; Rated Current: 70mA; DC Resistance: 650mΩ; RoHS: Yes; ComponentLink1Description: Datasheet; ComponentLink1URL: https://wmsc.lcsc.com/wmsc/upload/file/pdf/v2/lcsc/2304140030_TDK-MLF1608DR68JTD25_C404519.pdf; ComponentLink2Description: JLCPCB Part URL; ComponentLink2URL: https://jlcpcb.com/partdetail/C404519; ComponentLink3Description: LCSC Part URL; ComponentLink3URL: https://lcsc.com/product-detail/Inductors-SMD_TDK-TDK-MLF1608DR68JTD25_C404519.html
footprint IND-0603 (0603 (1608M) Inductor)
pins: 1, 2

## MLF1608DR68KTA00
designator L?  Inductance: 680nH
Inductor, 680nH, ±10%, 650mΩ, 70mA, SMD 0603; Manufacturer: TDK; Manufacturer Part Number: MLF1608DR68KTA00; Self-Resonant Frequency: 210MHz; Q Factor: 30@25MHz; Package Size: 0603; JLCPCB Basic Part: No; JLCPCB Part Number: C108903; Supplier 1: LCSC; Category: Inductors; Supplier Part Number 1: C108903; Tolerance: ±10%; Rated Current: 70mA; DC Resistance: 650mΩ; RoHS: Yes; ComponentLink1Description: Datasheet; ComponentLink1URL: https://wmsc.lcsc.com/wmsc/upload/file/pdf/v2/lcsc/2304140030_TDK-MLF1608DR68KTA00_C108903.pdf; ComponentLink2Description: JLCPCB Part URL; ComponentLink2URL: https://jlcpcb.com/partdetail/C108903; ComponentLink3Description: LCSC Part URL; ComponentLink3URL: https://lcsc.com/product-detail/Inductors-SMD_TDK-TDK-MLF1608DR68KTA00_C108903.html
footprint IND-0603 (0603 (1608M) Inductor)
pins: 1, 2

## MLF1608DR82JT000
designator L?  Inductance: 820nH
Inductor, 820nH, ±5%, 750mΩ, 70mA, SMD 0603; Manufacturer: TDK; Manufacturer Part Number: MLF1608DR82JT000; Self-Resonant Frequency: 130MHz; Q Factor: 15@25MHz; Package Size: 0603; JLCPCB Basic Part: No; JLCPCB Part Number: C275360; Supplier 1: LCSC; Category: Inductors; Supplier Part Number 1: C275360; Tolerance: ±5%; Rated Current: 70mA; DC Resistance: 750mΩ; RoHS: Yes; ComponentLink1Description: Datasheet; ComponentLink1URL: https://wmsc.lcsc.com/wmsc/upload/file/pdf/v2/lcsc/1811131651_TDK-MLF1608DR82JT000_C275360.pdf; ComponentLink2Description: JLCPCB Part URL; ComponentLink2URL: https://jlcpcb.com/partdetail/C275360; ComponentLink3Description: LCSC Part URL; ComponentLink3URL: https://lcsc.com/product-detail/Inductors-SMD_TDK-TDK-MLF1608DR82JT000_C275360.html
footprint IND-0603 (0603 (1608M) Inductor)
pins: 1, 2

## MLF1608DR82JTD25
designator L?  Inductance: 820nH
Inductor, 820nH, ±5%, 750mΩ, 70mA, SMD 0603; Manufacturer: TDK; Manufacturer Part Number: MLF1608DR82JTD25; Self-Resonant Frequency: 190MHz; Q Factor: 30@25MHz; Package Size: 0603; JLCPCB Basic Part: No; JLCPCB Part Number: C404520; Supplier 1: LCSC; Category: Inductors; Supplier Part Number 1: C404520; Tolerance: ±5%; Rated Current: 70mA; DC Resistance: 750mΩ; RoHS: Yes; ComponentLink1Description: Datasheet; ComponentLink1URL: https://wmsc.lcsc.com/wmsc/upload/file/pdf/v2/lcsc/2304140030_TDK-MLF1608DR82JTD25_C404520.pdf; ComponentLink2Description: JLCPCB Part URL; ComponentLink2URL: https://jlcpcb.com/partdetail/C404520; ComponentLink3Description: LCSC Part URL; ComponentLink3URL: https://lcsc.com/product-detail/Inductors-SMD_TDK-TDK-MLF1608DR82JTD25_C404520.html
footprint IND-0603 (0603 (1608M) Inductor)
pins: 1, 2

## MLF1608E5R6KTA00
designator L?  Inductance: 5.6uH
Inductor, 5.6uH, ±10%, 550mΩ, 15mA, SMD 0603; Manufacturer: TDK; Manufacturer Part Number: MLF1608E5R6KTA00; Self-Resonant Frequency: 70MHz; Q Factor: 60@4MHz; Package Size: 0603; JLCPCB Basic Part: No; JLCPCB Part Number: C76734; Supplier 1: LCSC; Category: Inductors; Supplier Part Number 1: C76734; Tolerance: ±10%; Rated Current: 15mA; DC Resistance: 550mΩ; RoHS: Yes; ComponentLink1Description: Datasheet; ComponentLink1URL: https://wmsc.lcsc.com/wmsc/upload/file/pdf/v2/lcsc/2304140030_TDK-MLF1608E5R6KTA00_C76734.pdf; ComponentLink2Description: JLCPCB Part URL; ComponentLink2URL: https://jlcpcb.com/partdetail/C76734; ComponentLink3Description: LCSC Part URL; ComponentLink3URL: https://lcsc.com/product-detail/Inductors-SMD_TDK-TDK-MLF1608E5R6KTA00_C76734.html
footprint IND-0603 (0603 (1608M) Inductor)
pins: 1, 2

## MLF1608E6R8KTA00
designator L?  Inductance: 6.8uH
Inductor, 6.8uH, ±10%, 650mΩ, 15mA, SMD 0603; Manufacturer: TDK; Manufacturer Part Number: MLF1608E6R8KTA00; Self-Resonant Frequency: 40MHz; Q Factor: 35@4MHz; Package Size: 0603; JLCPCB Basic Part: No; JLCPCB Part Number: C275364; Supplier 1: LCSC; Category: Inductors; Supplier Part Number 1: C275364; Tolerance: ±10%; Rated Current: 15mA; DC Resistance: 650mΩ; RoHS: Yes; ComponentLink1Description: Datasheet; ComponentLink1URL: https://wmsc.lcsc.com/wmsc/upload/file/pdf/v2/lcsc/2304140030_TDK-MLF1608E6R8KTA00_C275364.pdf; ComponentLink2Description: JLCPCB Part URL; ComponentLink2URL: https://jlcpcb.com/partdetail/C275364; ComponentLink3Description: LCSC Part URL; ComponentLink3URL: https://lcsc.com/product-detail/Inductors-SMD_TDK-TDK-MLF1608E6R8KTA00_C275364.html
footprint IND-0603 (0603 (1608M) Inductor)
pins: 1, 2

## MLF1608E6R8MTD25
designator L?  Inductance: 6.8uH
Inductor, 6.8uH, ±20%, 650mΩ, 15mA, SMD 0603; Manufacturer: TDK; Manufacturer Part Number: MLF1608E6R8MTD25; Self-Resonant Frequency: 40MHz; Q Factor: 35@4MHz; Package Size: 0603; JLCPCB Basic Part: No; JLCPCB Part Number: C2044652; Supplier 1: LCSC; Category: Inductors; Supplier Part Number 1: C2044652; Tolerance: ±20%; Rated Current: 15mA; DC Resistance: 650mΩ; RoHS: Yes; ComponentLink1Description: Datasheet; ComponentLink1URL: https://wmsc.lcsc.com/wmsc/upload/file/pdf/v2/lcsc/2304140030_TDK-MLF1608E6R8MTD25_C2044652.pdf; ComponentLink2Description: JLCPCB Part URL; ComponentLink2URL: https://jlcpcb.com/partdetail/C2044652; ComponentLink3Description: LCSC Part URL; ComponentLink3URL: https://lcsc.com/product-detail/Inductors-SMD_TDK-TDK-MLF1608E6R8MTD25_C2044652.html
footprint IND-0603 (0603 (1608M) Inductor)
pins: 1, 2

## MLF1608E8R2JT000
designator L?  Inductance: 8.2uH
Inductor, 8.2uH, ±5%, 800mΩ, 10mA, SMD 0603; Manufacturer: TDK; Manufacturer Part Number: MLF1608E8R2JT000; Self-Resonant Frequency: 55MHz; Q Factor: 60@4MHz; Package Size: 0603; JLCPCB Basic Part: No; JLCPCB Part Number: C76735; Supplier 1: LCSC; Category: Inductors; Supplier Part Number 1: C76735; Tolerance: ±5%; Rated Current: 10mA; DC Resistance: 800mΩ; RoHS: Yes; ComponentLink1Description: Datasheet; ComponentLink1URL: https://wmsc.lcsc.com/wmsc/upload/file/pdf/v2/lcsc/2304140030_TDK-MLF1608E8R2JT000_C76735.pdf; ComponentLink2Description: JLCPCB Part URL; ComponentLink2URL: https://jlcpcb.com/partdetail/C76735; ComponentLink3Description: LCSC Part URL; ComponentLink3URL: https://lcsc.com/product-detail/Inductors-SMD_TDK-TDK-MLF1608E8R2JT000_C76735.html
footprint IND-0603 (0603 (1608M) Inductor)
pins: 1, 2

## MLF1608E100JT000
designator L?  Inductance: 10uH
Inductor, 10uH, ±5%, 1Ω, 10mA, SMD 0603; Manufacturer: TDK; Manufacturer Part Number: MLF1608E100JT000; Self-Resonant Frequency: 30MHz; Q Factor: 30@2MHz; Package Size: 0603; JLCPCB Basic Part: No; JLCPCB Part Number: C275361; Supplier 1: LCSC; Category: Inductors; Supplier Part Number 1: C275361; Tolerance: ±5%; Rated Current: 10mA; DC Resistance: 1Ω; RoHS: Yes; ComponentLink1Description: Datasheet; ComponentLink1URL: https://wmsc.lcsc.com/wmsc/upload/file/pdf/v2/lcsc/2304140030_TDK-MLF1608E100JT000_C275361.pdf; ComponentLink2Description: JLCPCB Part URL; ComponentLink2URL: https://jlcpcb.com/partdetail/C275361; ComponentLink3Description: LCSC Part URL; ComponentLink3URL: https://lcsc.com/product-detail/Inductors-SMD_TDK-TDK-MLF1608E100JT000_C275361.html
footprint IND-0603 (0603 (1608M) Inductor)
pins: 1, 2

## MLF1608E100KTD00
designator L?  Inductance: 10uH
Inductor, 10uH, ±10%, 1Ω, 10mA, SMD 0603; Manufacturer: TDK; Manufacturer Part Number: MLF1608E100KTD00; Self-Resonant Frequency: 30MHz; Q Factor: 30@2MHz; Package Size: 0603; JLCPCB Basic Part: No; JLCPCB Part Number: C76732; Supplier 1: LCSC; Category: Inductors; Supplier Part Number 1: C76732; Tolerance: ±10%; Rated Current: 10mA; DC Resistance: 1Ω; RoHS: Yes; ComponentLink1Description: Datasheet; ComponentLink1URL: https://wmsc.lcsc.com/wmsc/upload/file/pdf/v2/lcsc/2304140030_TDK-MLF1608E100KTD00_C76732.pdf; ComponentLink2Description: JLCPCB Part URL; ComponentLink2URL: https://jlcpcb.com/partdetail/C76732; ComponentLink3Description: LCSC Part URL; ComponentLink3URL: https://lcsc.com/product-detail/Inductors-SMD_TDK-TDK-MLF1608E100KTD00_C76732.html
footprint IND-0603 (0603 (1608M) Inductor)
pins: 1, 2

## MLF1608E100KTD25
designator L?  Inductance: 10uH
Inductor, 10uH, ±10%, 1Ω, 10mA, SMD 0603; Manufacturer: TDK; Manufacturer Part Number: MLF1608E100KTD25; Self-Resonant Frequency: 30MHz; Q Factor: 30@2MHz; Package Size: 0603; JLCPCB Basic Part: No; JLCPCB Part Number: C2044123; Supplier 1: LCSC; Category: Inductors; Supplier Part Number 1: C2044123; Tolerance: ±10%; Rated Current: 10mA; DC Resistance: 1Ω; RoHS: Yes; ComponentLink1Description: Datasheet; ComponentLink1URL: https://wmsc.lcsc.com/wmsc/upload/file/pdf/v2/lcsc/2304140030_TDK-MLF1608E100KTD25_C2044123.pdf; ComponentLink2Description: JLCPCB Part URL; ComponentLink2URL: https://jlcpcb.com/partdetail/C2044123; ComponentLink3Description: LCSC Part URL; ComponentLink3URL: https://lcsc.com/product-detail/Inductors-SMD_TDK-TDK-MLF1608E100KTD25_C2044123.html
footprint IND-0603 (0603 (1608M) Inductor)
pins: 1, 2

## MLF1608E120JT000
designator L?  Inductance: 12uH
Inductor, 12uH, ±5%, 1.2Ω, 10mA, SMD 0603; Manufacturer: TDK; Manufacturer Part Number: MLF1608E120JT000; Self-Resonant Frequency: 25MHz; Q Factor: 30@2MHz; Package Size: 0603; JLCPCB Basic Part: No; JLCPCB Part Number: C76733; Supplier 1: LCSC; Category: Inductors; Supplier Part Number 1: C76733; Tolerance: ±5%; Rated Current: 10mA; DC Resistance: 1.2Ω; RoHS: Yes; ComponentLink1Description: Datasheet; ComponentLink1URL: https://wmsc.lcsc.com/wmsc/upload/file/pdf/v2/lcsc/2304140030_TDK-MLF1608E120JT000_C76733.pdf; ComponentLink2Description: JLCPCB Part URL; ComponentLink2URL: https://jlcpcb.com/partdetail/C76733; ComponentLink3Description: LCSC Part URL; ComponentLink3URL: https://lcsc.com/product-detail/Inductors-SMD_TDK-TDK-MLF1608E120JT000_C76733.html
footprint IND-0603 (0603 (1608M) Inductor)
pins: 1, 2

## MLF1608E120JTD25
designator L?  Inductance: 12uH
Inductor, 12uH, ±5%, 1.2Ω, 10mA, SMD 0603; Manufacturer: TDK; Manufacturer Part Number: MLF1608E120JTD25; Self-Resonant Frequency: 25MHz; Q Factor: 30@2MHz; Package Size: 0603; JLCPCB Basic Part: No; JLCPCB Part Number: C275362; Supplier 1: LCSC; Category: Inductors; Supplier Part Number 1: C275362; Tolerance: ±5%; Rated Current: 10mA; DC Resistance: 1.2Ω; RoHS: Yes; ComponentLink1Description: Datasheet; ComponentLink1URL: https://wmsc.lcsc.com/wmsc/upload/file/pdf/v2/lcsc/2304140030_TDK-MLF1608E120JTD25_C275362.pdf; ComponentLink2Description: JLCPCB Part URL; ComponentLink2URL: https://jlcpcb.com/partdetail/C275362; ComponentLink3Description: LCSC Part URL; ComponentLink3URL: https://lcsc.com/product-detail/Inductors-SMD_TDK-TDK-MLF1608E120JTD25_C275362.html
footprint IND-0603 (0603 (1608M) Inductor)
pins: 1, 2

## MLG1608B1N2ST000
designator L?  Inductance: 1.2nH
Inductor, 1.2nH, 40mΩ, 600mA, SMD 0603; Manufacturer: TDK; Manufacturer Part Number: MLG1608B1N2ST000; Self-Resonant Frequency: 20GHz; Q Factor: 8@100MHz; Package Size: 0603; JLCPCB Basic Part: No; JLCPCB Part Number: C87537; Supplier 1: LCSC; Category: Inductors; Supplier Part Number 1: C87537; Rated Current: 600mA; DC Resistance: 40mΩ; RoHS: Yes; ComponentLink1Description: Datasheet; ComponentLink1URL: https://wmsc.lcsc.com/wmsc/upload/file/pdf/v2/lcsc/2304140030_TDK-MLG1608B1N2ST000_C87537.pdf; ComponentLink2Description: JLCPCB Part URL; ComponentLink2URL: https://jlcpcb.com/partdetail/C87537; ComponentLink3Description: LCSC Part URL; ComponentLink3URL: https://lcsc.com/product-detail/Inductors-SMD_TDK-TDK-MLG1608B1N2ST000_C87537.html
footprint IND-0603 (0603 (1608M) Inductor)
pins: 1, 2

## MLG1608B56NJT000
designator L?  Inductance: 56nH
Inductor, 56nH, ±5%, 410mΩ, 400mA, SMD 0603; Manufacturer: TDK; Manufacturer Part Number: MLG1608B56NJT000; Self-Resonant Frequency: 1.8GHz; Q Factor: 14@100MHz; Package Size: 0603; JLCPCB Basic Part: No; JLCPCB Part Number: C87538; Supplier 1: LCSC; Category: Inductors; Supplier Part Number 1: C87538; Tolerance: ±5%; Rated Current: 400mA; DC Resistance: 410mΩ; RoHS: Yes; ComponentLink1Description: Datasheet; ComponentLink1URL: https://wmsc.lcsc.com/wmsc/upload/file/pdf/v2/lcsc/2304140030_TDK-MLG1608B56NJT000_C87538.pdf; ComponentLink2Description: JLCPCB Part URL; ComponentLink2URL: https://jlcpcb.com/partdetail/C87538; ComponentLink3Description: LCSC Part URL; ComponentLink3URL: https://lcsc.com/product-detail/Inductors-SMD_TDK-TDK-MLG1608B56NJT000_C87538.html
footprint IND-0603 (0603 (1608M) Inductor)
pins: 1, 2

## MLI1608-1R0_f_
designator L?  Inductance: 1uH
Inductor, 1uH, ±10%, 600mΩ, 25mA, SMD 0603; Manufacturer: Meled; Manufacturer Part Number: MLI1608-1R0（f）; Package Size: 0603; JLCPCB Basic Part: No; JLCPCB Part Number: C12374; Supplier 1: LCSC; Category: Inductors; Supplier Part Number 1: C12374; Tolerance: ±10%; Rated Current: 25mA; DC Resistance: 600mΩ; RoHS: Yes; ComponentLink1Description: Datasheet; ComponentLink1URL: https://wmsc.lcsc.com/wmsc/upload/file/pdf/v2/lcsc/1811111206_MetalLions-MLI1608-1R0-f-_C12374.pdf; ComponentLink2Description: JLCPCB Part URL; ComponentLink2URL: https://jlcpcb.com/partdetail/C12374; ComponentLink3Description: LCSC Part URL; ComponentLink3URL: https://lcsc.com/product-detail/Inductors-SMD_Meled-Meled-MLI1608-1R0%EF%BC%88f%EF%BC%89_C12374.html
footprint IND-0603 (0603 (1608M) Inductor)
pins: 1, 2

## MLI1608-2N0_f_
designator L?  Inductance: 2nH
Inductor, 2nH, 200mΩ, 500mA, SMD 0603; Manufacturer: Meled; Manufacturer Part Number: MLI1608-2N0(f); Package Size: 0603; JLCPCB Basic Part: No; JLCPCB Part Number: C40464; Supplier 1: LCSC; Category: Inductors; Supplier Part Number 1: C40464; Rated Current: 500mA; DC Resistance: 200mΩ; RoHS: Yes; ComponentLink1Description: Datasheet; ComponentLink1URL: https://wmsc.lcsc.com/wmsc/upload/file/pdf/v2/lcsc/1810191516_MetalLions-MLI1608-2N0-f_C40464.pdf; ComponentLink2Description: JLCPCB Part URL; ComponentLink2URL: https://jlcpcb.com/partdetail/C40464; ComponentLink3Description: LCSC Part URL; ComponentLink3URL: https://lcsc.com/product-detail/Inductors-SMD_Meled-Meled-MLI1608-2N0f_C40464.html
footprint IND-0603 (0603 (1608M) Inductor)
pins: 1, 2

## MLI1608-3N0_F_
designator L?  Inductance: 3nH
Inductor, 3nH, 190mΩ, 400mA, SMD 0603; Manufacturer: Meled; Manufacturer Part Number: MLI1608-3N0(F); Package Size: 0603; JLCPCB Basic Part: No; JLCPCB Part Number: C40465; Supplier 1: LCSC; Category: Inductors; Supplier Part Number 1: C40465; Rated Current: 400mA; DC Resistance: 190mΩ; RoHS: Yes; ComponentLink1Description: Datasheet; ComponentLink1URL: https://wmsc.lcsc.com/wmsc/upload/file/pdf/v2/lcsc/1809191913_MetalLions-MLI1608-3N0-F_C40465.pdf; ComponentLink2Description: JLCPCB Part URL; ComponentLink2URL: https://jlcpcb.com/partdetail/C40465; ComponentLink3Description: LCSC Part URL; ComponentLink3URL: https://lcsc.com/product-detail/Inductors-SMD_Meled-Meled-MLI1608-3N0F_C40465.html
footprint IND-0603 (0603 (1608M) Inductor)
pins: 1, 2

## MLI1608-36N_f_
designator L?  Inductance: 36nH
Inductor, 36nH, ±5%, 700mΩ, 300mA, SMD 0603; Manufacturer: Meled; Manufacturer Part Number: MLI1608-36N(f); Package Size: 0603; JLCPCB Basic Part: No; JLCPCB Part Number: C48589; Supplier 1: LCSC; Category: Inductors; Supplier Part Number 1: C48589; Tolerance: ±5%; Rated Current: 300mA; DC Resistance: 700mΩ; RoHS: Yes; ComponentLink1Description: Datasheet; ComponentLink1URL: https://wmsc.lcsc.com/wmsc/upload/file/pdf/v2/lcsc/1809192221_MetalLions-MLI1608-36N-f_C48589.pdf; ComponentLink2Description: JLCPCB Part URL; ComponentLink2URL: https://jlcpcb.com/partdetail/C48589; ComponentLink3Description: LCSC Part URL; ComponentLink3URL: https://lcsc.com/product-detail/Inductors-SMD_Meled-Meled-MLI1608-36Nf_C48589.html
footprint IND-0603 (0603 (1608M) Inductor)
pins: 1, 2

## MLI1608-R10_F_
designator L?  Inductance: 100nH
Inductor, 100nH, ±5%, 1Ω, 300mA, SMD 0603; Manufacturer: Meled; Manufacturer Part Number: MLI1608-R10(F); Package Size: 0603; JLCPCB Basic Part: No; JLCPCB Part Number: C49329; Supplier 1: LCSC; Category: Inductors; Supplier Part Number 1: C49329; Tolerance: ±5%; Rated Current: 300mA; DC Resistance: 1Ω; RoHS: Yes; ComponentLink1Description: Datasheet; ComponentLink1URL: https://wmsc.lcsc.com/wmsc/upload/file/pdf/v2/lcsc/1809140023_MetalLions-MLI1608-R10-F_C49329.pdf; ComponentLink2Description: JLCPCB Part URL; ComponentLink2URL: https://jlcpcb.com/partdetail/C49329; ComponentLink3Description: LCSC Part URL; ComponentLink3URL: https://lcsc.com/product-detail/Inductors-SMD_Meled-Meled-MLI1608-R10F_C49329.html
footprint IND-0603 (0603 (1608M) Inductor)
pins: 1, 2
